# Altium footprint library cap.PcbLib: 31 footprints (part 1 of 2)
Each footprint in its own frame and in the unit in brackets; x right, y up, seen from the top. Pads: shape width x height; smd on the part's side, far side on the other; paste and mask are expansions set on the pad; w line width, h text height; cw(c..) or ccw(c..) is an arc to the next point about the centre after c.
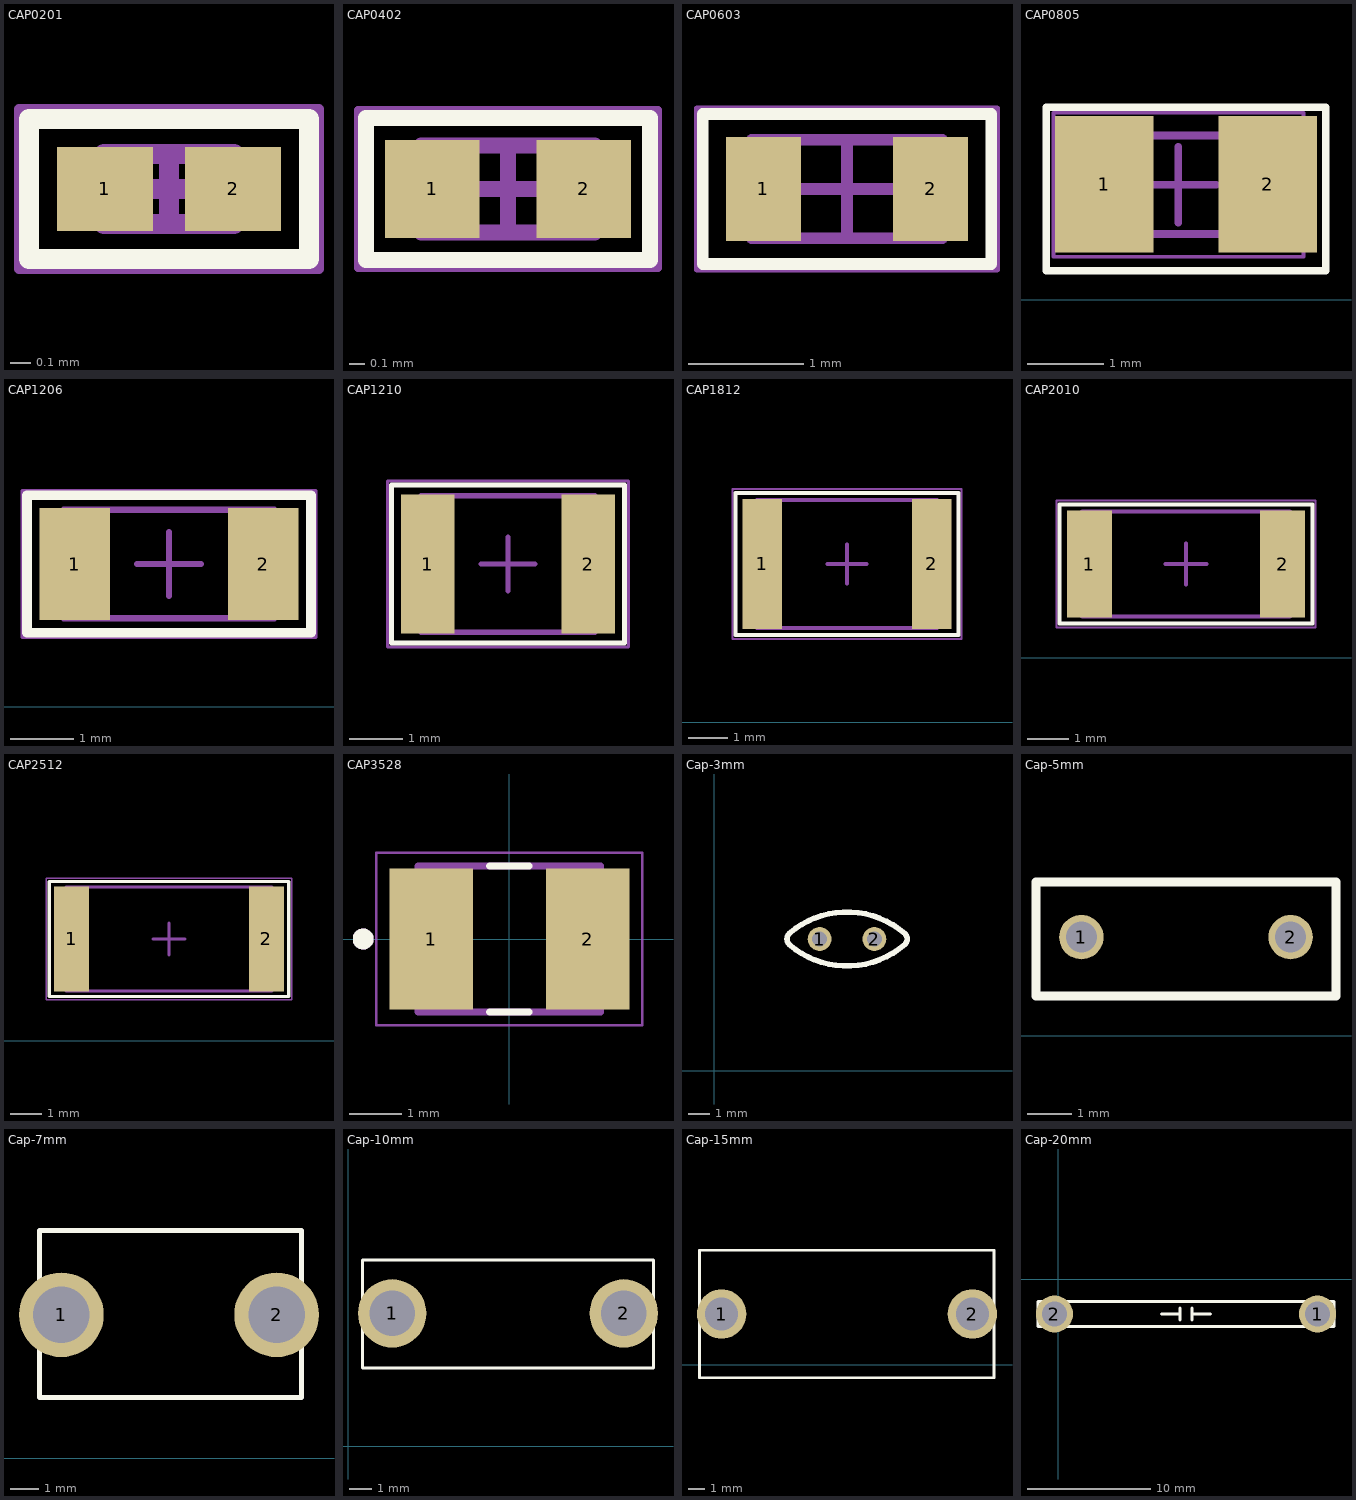
[diagram p0: the footprints below, top view; thin cyan lines are the x and y axes]

## CAP0201 [mm]
height 0.23
pads (2):
  rect 0.48x0.42 smd mask+0.04: 1(3.844,3.272) 2(4.484,3.272)
Top Overlay:
  lines w0.1: 3.464,2.922 4.514,2.922 4.864,2.922 4.864,3.622 4.514,3.622 3.464,3.622 3.464,2.922
Mechanical 13:
  lines w0.1: 3.839,3.097 4.489,3.097 4.489,3.447 3.839,3.447 3.839,3.097
Mechanical 15:
  lines w0.05: 3.414,2.872 4.914,2.872 4.914,3.672 3.414,3.672 3.414,2.872
  lines w0.1: 3.989,3.272 4.339,3.272 ; 4.164,3.097 4.164,3.447
3D body "CAP0201.step": height 0.23, standoff 0, extent 3.839,3.097 4.489,3.447

## CAP0402 [mm]
height 0.32
pads (2):
  rect 0.6x0.62 smd mask+0.06: 1(2.729,2.694) 2(3.689,2.694)
Top Overlay:
  lines w0.1: 2.309,2.244 3.659,2.244 4.109,2.244 4.109,3.144 3.659,3.144 2.309,3.144 2.309,2.244
Mechanical 13:
  lines w0.1: 2.659,2.419 2.659,2.969 3.759,2.969 3.759,2.419 2.659,2.419
Mechanical 15:
  lines w0.05: 2.259,2.194 2.259,3.194 4.159,3.194 4.159,2.194 2.259,2.194
  lines w0.1: 2.934,2.694 3.484,2.694 ; 3.209,2.419 3.209,2.969
3D body "CAP0402.step": height 0.32, standoff 0, extent 2.659,2.419 3.759,2.969

## CAP0603 [mm]
height 0.4
pads (2):
  rect 0.65x0.9 smd: 1(2.417,1.568) 2(3.867,1.568)
Top Overlay:
  lines w0.1: 2.242,0.918 4.392,0.918 4.392,2.218 3.767,2.218 ; 2.517,0.918 1.892,0.918 1.892,2.218 3.932,2.218
Mechanical 13:
  lines w0.1: 2.317,1.143 3.967,1.143 3.967,1.993 2.317,1.993 2.317,1.143
Mechanical 15:
  lines w0.05: 1.842,0.868 4.442,0.868 4.442,2.268 1.842,2.268 1.842,0.868
  lines w0.1: 2.717,1.568 3.567,1.568 ; 3.142,1.143 3.142,1.993
3D body "CAP0603.step": height 0.4, standoff 0, extent 2.317,1.143 3.967,1.993

## CAP0805 [mm]
height 0.5
pads (2):
  rect 1.3x1.8 smd: 1(1.143,1.524) 2(3.302,1.524)
Top Overlay:
  lines w0.1: 2.921,0.381 3.172,0.381 3.705,0.381 4.064,0.381 4.064,2.54 1.483,2.54 0.381,2.54 0.381,0.381 3.123,0.381
Mechanical 13:
  lines w0.1: 1.098,0.867 1.098,2.167 3.148,2.167 3.148,0.867 1.098,0.867
Mechanical 15:
  lines w0.05: 0.473,0.567 0.473,2.467 3.773,2.467 3.773,0.567 0.473,0.567
  lines w0.1: 1.623,1.517 2.623,1.517 ; 2.123,1.017 2.123,2.017
3D body "CAP0805.step": height 0.5, standoff 0, extent 1.098,0.867 3.148,2.167

## CAP1206 [mm]
height 0.94
pads (2):
  rect 1.1x1.75 smd: 1(2.821,2.24) 2(5.771,2.24)
Top Overlay:
  lines w0.15: 2.071,1.165 5.409,1.165 6.521,1.165 6.521,3.315 5.409,3.315 2.071,3.315 2.071,1.165
Mechanical 13:
  lines w0.1: 2.646,1.39 2.646,3.09 5.946,3.09 5.946,1.39 2.646,1.39
Mechanical 15:
  lines w0.05: 1.996,1.09 1.996,3.39 6.596,3.39 6.596,1.09 1.996,1.09
  lines w0.1: 3.796,2.24 4.796,2.24 ; 4.296,1.74 4.296,2.74
3D body "CAP1206.step": height 0.94, standoff 0, extent 2.646,1.39 5.946,3.09

## CAP1210 [mm]
height 0.55
pads (2):
  rect 1x2.6 smd: 1(4.753,3.979) 2(7.753,3.979)
Top Overlay:
  lines w0.1: 4.078,2.504 7.34,2.504 8.428,2.504 8.428,5.454 7.34,5.454 4.078,5.454 4.078,2.504
Mechanical 13:
  lines w0.1: 4.628,2.704 7.878,2.704 7.878,5.254 4.628,5.254 4.628,2.704
Mechanical 15:
  lines w0.05: 4.003,2.429 8.503,2.429 8.503,5.529 4.003,5.529 4.003,2.429
  lines w0.1: 5.753,3.979 6.753,3.979 ; 6.253,3.479 6.253,4.479
3D body "CAP1210.step": height 0.55, standoff 0, extent 4.628,2.704 7.878,5.254

## CAP1812 [mm]
height 0.55
pads (2):
  rect 1x3.3 smd: 1(5.346,4.008) 2(9.646,4.008)
Top Overlay:
  lines w0.1: 4.671,2.208 8.909,2.208 10.321,2.208 10.321,5.808 8.909,5.808 4.671,5.808 4.671,2.208
Mechanical 13:
  lines w0.1: 5.221,2.383 9.771,2.383 9.771,5.633 5.221,5.633 5.221,2.383
Mechanical 15:
  lines w0.05: 4.596,2.108 10.396,2.108 10.396,5.908 4.596,5.908 4.596,2.108
  lines w0.1: 6.996,4.008 7.996,4.008 ; 7.496,3.508 7.496,4.508
3D body "CAP1812.step": height 0.55, standoff 0, extent 5.221,2.383 9.771,5.633

## CAP2010 [mm]
height 0.55
pads (2):
  rect 1.1x2.6 smd: 1(5.064,2.279) 2(9.764,2.279)
Top Overlay:
  lines w0.1: 8.952,0.829 10.489,0.829 10.489,3.729 8.952,3.729 ; 9.104,3.729 4.339,3.729 4.339,0.829 9.214,0.829
Mechanical 13:
  lines w0.1: 4.889,1.004 9.939,1.004 9.939,3.554 4.889,3.554 4.889,1.004
Mechanical 15:
  lines w0.05: 4.264,0.729 10.564,0.729 10.564,3.829 4.264,3.829 4.264,0.729
  lines w0.1: 6.914,2.279 7.914,2.279 ; 7.414,1.779 7.414,2.779
3D body "CAP2010.step": height 0.55, standoff 0, extent 4.889,1.004 9.939,3.554

## CAP2512 [mm]
height 0.55
pads (2):
  rect 1.1x3.3 smd: 1(4.566,3.195) 2(10.666,3.195)
Top Overlay:
  lines w0.1: 3.866,1.395 3.866,4.995 9.491,4.995 11.366,4.995 11.366,1.395 9.491,1.395 3.866,1.395
Mechanical 13:
  lines w0.1: 4.391,1.57 4.391,4.82 10.841,4.82 10.841,1.57 4.391,1.57
Mechanical 15:
  lines w0.05: 3.766,1.295 3.766,5.095 11.466,5.095 11.466,1.295 3.766,1.295
  lines w0.1: 7.116,3.195 8.116,3.195 ; 7.616,2.695 7.616,3.695
3D body "CAP2512.step": height 0.7, standoff 0, extent 4.391,1.57 10.841,4.82

## CAP3528 [mm]
pads (2):
  rect 1.6x2.7 smd: 1(-1.5,0) 2(1.5,0)
Top Overlay:
  circle w0.2: c-2.8,0 r0.1
  lines w0.127: -0.38,-1.4 0.38,-1.4 ; -0.38,1.4 0.38,1.4
Mechanical 13:
  circle w0.2: c-2.8,0 r0.1
  lines w0.127: -1.75,-1.4 1.75,-1.4 1.75,1.4 -1.75,1.4 -1.75,-1.4
Mechanical 15:
  lines w0.05: -2.55,-1.65 2.55,-1.65 2.55,1.65 -2.55,1.65 -2.55,-1.65
3D body "step_temp.STEP": height 3.5, standoff 1.6, extent -1.778,-1.4 1.722,1.4

## Cap-3mm [mm]
pads (2):
  round 1.1 hole 0.7: 1(4.881,6.095) 2(7.421,6.095)
Top Overlay:
  lines w0.254: 3.463,5.846 ccw(c6.151,8.944) 8.845,5.852 ; 3.463,6.344 cw(c6.151,3.246) 8.845,6.338 ; 3.469,5.853 cw(c3.711,6.095) 3.469,6.337 ; 8.843,5.853 ccw(c8.602,6.095) 8.843,6.337
3D body "Cap 100n.STEP": height 6.92, standoff -1, extent 3.232,5.231 9.07,6.928

## Cap-5mm [mm]
pads (2):
  round 1 hole 0.7: 1(6.76,2.215) 2(11.46,2.215)
Top Overlay:
  lines w0.2: 5.739,0.887 5.739,3.457 12.48,3.457 12.48,0.887 5.739,0.887
3D body "cap.STEP": height 6.84, standoff -1.46, extent 6.01,1.015 12.31,3.415

## Cap-7mm [mm]
pads (2):
  round 3 hole 2: 1(2.695,5.078) 2(10.315,5.078)
Top Overlay:
  lines w0.178: 1.92,2.147 1.92,8.066 11.191,8.066 11.191,2.147 1.92,2.147
3D body "Cap 100n - 400V Poly.STEP": height 11.68, standoff -2.24, extent 1.92,2.147 11.191,8.066

## Cap-10mm [mm]
pads (2):
  round 3 hole 2: 1(1.92,5.829) 2(12.08,5.829)
Top Overlay:
  lines w0.127: 0.625,3.428 13.375,3.428 13.375,8.179 0.625,8.179 0.625,3.428
3D body "Cap 10n - 630V Poly_2009.STEP": height 12.19, standoff -1.73, extent 0.625,3.428 13.375,8.179

## Cap-15mm [mm]
pads (2):
  round 3 hole 2: 1(5.299,3.091) 2(20.539,3.091)
Top Overlay:
  lines w0.178: 3.953,-0.783 21.86,-0.783 21.86,6.965 3.953,6.965 3.953,-0.783
3D body "Cap 220n - 400V Poly.STEP": height 12.92, standoff -1, extent 3.953,-0.783 21.86,6.965

## Cap-20mm [mm]
pads (2):
  round 3 hole 2: 1(21.044,-2.8) 2(-0.292,-2.8)
Top Overlay:
  lines w0.254: 8.376,-2.8 9.876,-2.8 ; 9.876,-3.3 9.876,-2.3 ; 10.876,-3.3 10.876,-2.3 ; 10.876,-2.8 12.376,-2.8 ; -1.624,-3.8 -1.624,-1.8 22.376,-1.8 22.376,-3.8 -1.624,-3.8
3D body "680nF.STEP": height 12.64, standoff -0.86, extent -1.616,-3.14 22.384,14.556